# Altium footprint library klp.PcbLib: 436 footprints (part 19 of 28)
Each footprint in its own frame and in the unit in brackets; x right, y up, seen from the top. Pads: shape width x height; smd on the part's side, far side on the other; paste and mask are expansions set on the pad; w line width, h text height; cw(c..) or ccw(c..) is an arc to the next point about the centre after c.
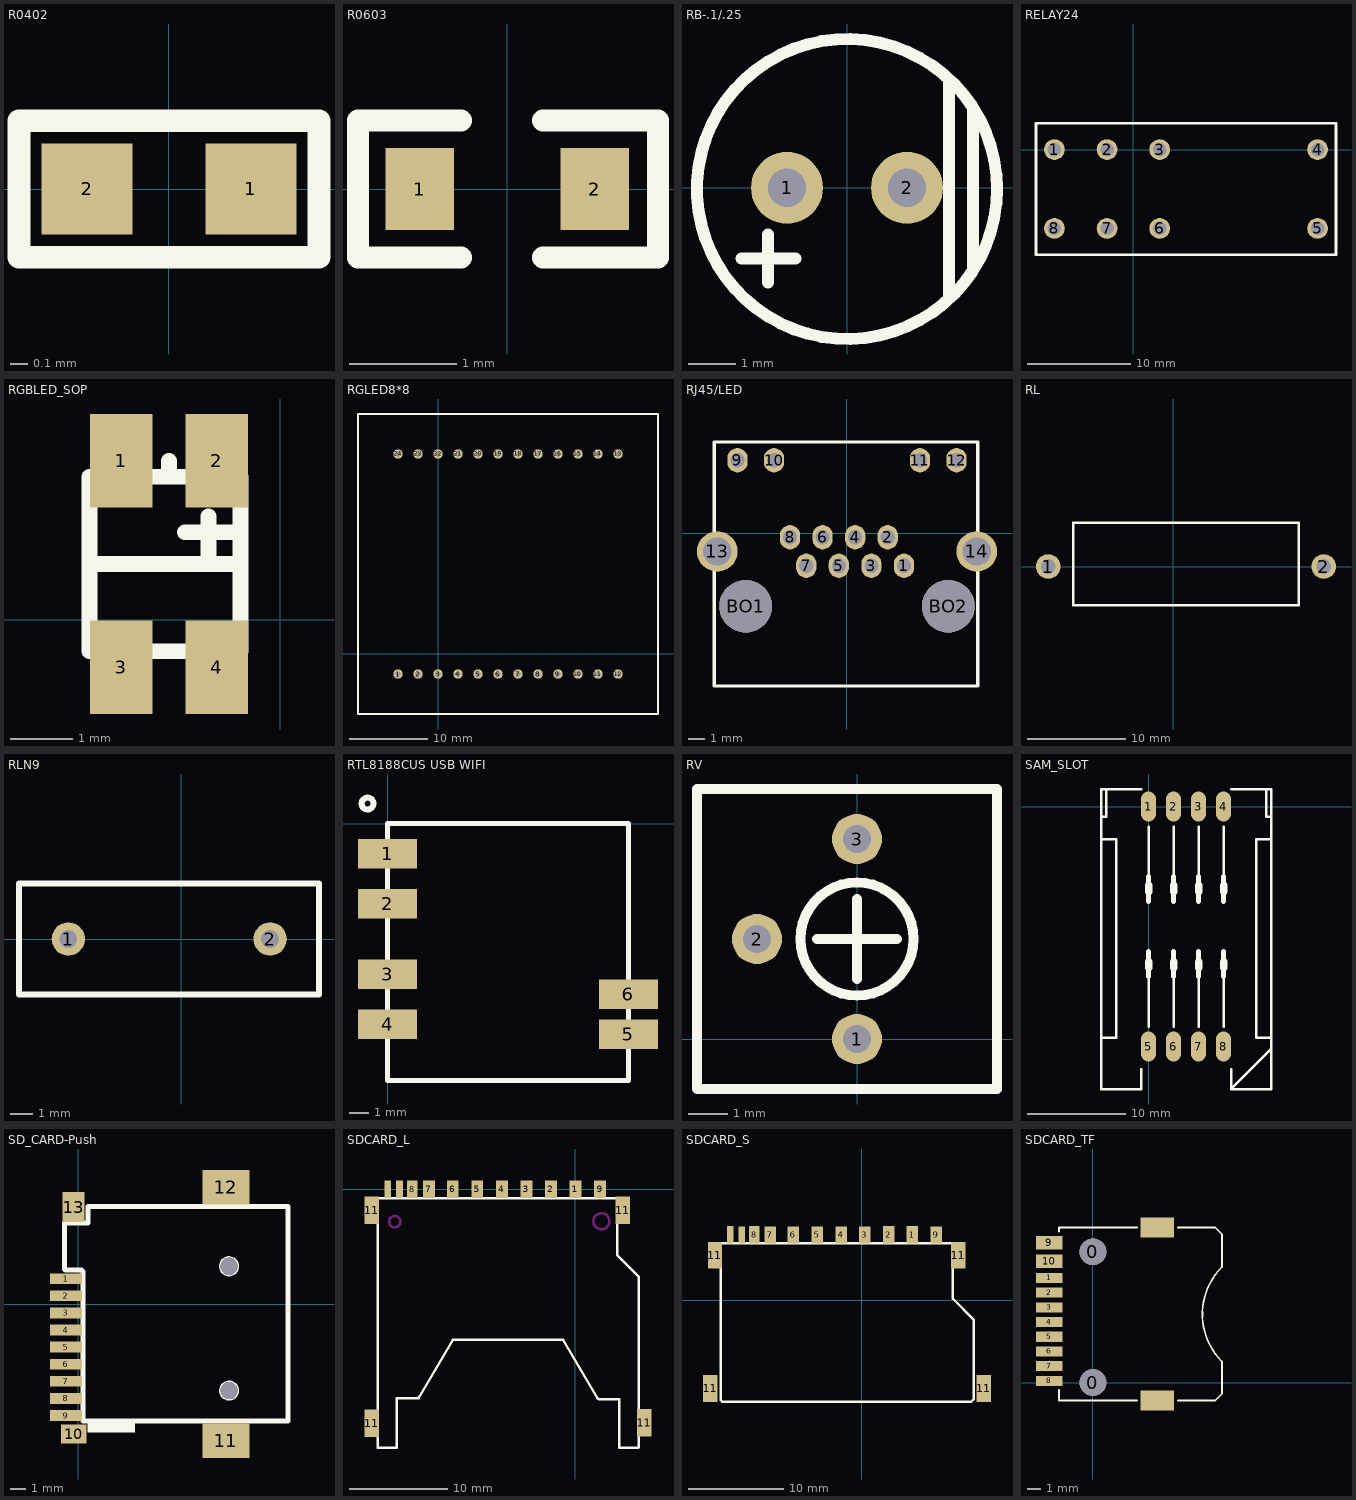
[diagram p18: the footprints below, top view; thin cyan lines are the x and y axes]

## R0402 [mil]
pads (2):
  rect 20x20 smd: 1(18,0) 2(-18,0)
Top Overlay:
  lines w5: -33,-15 33,-15 33,15 -33,15 -33,-15
3D body "R0402.step": height 13.98, standoff 0.2, extent -20.67,-9.83 18.7,9.85

## R0603 [mil]
pads (2):
  rect 25x30 smd: 1(-32,0) 2(32,0)
Top Overlay:
  lines w8: -17,-25.09 -54.63,-25.09 -54.63,25.09 -17,25.09 ; 13,-25.09 55.12,-25.09 55.12,25.09 13,25.09
3D body "R0603.step": height 18.7, standoff 0.98, extent -32.48,-15.75 30.51,15.75

## RB-.1/.25 [mil]
pads (2):
  round 60 hole 32: 1(-50,0) 2(50,0)
Top Overlay:
  circle w10: c0,-1 r125
  lines w10: -88,-59 -43,-59 ; -66,-79 -66,-39 ; 85,-91 85,89 ; 105,-66 105,64
3D body "Radial Capacitor 6.3mm(D) x 11mm(L) 2.5 mm lead spacing.STEP": height 452.76, standoff -728.35, extent -124.02,-124.02 124.02,124.02

## RELAY24 [mm] "HRM1H-S-DC34V-C"
height 20
pads (8):
  round 2 hole 1.3: 1(-7.62,0) 2(-2.54,0) 3(2.54,0) 4(17.78,0) 5(17.78,-7.62) 6(2.54,-7.62) 7(-2.54,-7.62) 8(-7.62,-7.62)
Top Overlay:
  lines w0.254: -9.398,-10.16 -9.398,2.54 19.558,2.54 19.558,-10.16 -9.398,-10.16

## RGBLED_SOP [mm] "SOP_RGB"
height 1
pads (4):
  rect 1x1.5 smd: 1(-2.54,2.54) 2(-1.016,2.54) 3(-2.54,-0.762) 4(-1.016,-0.762)
Top Overlay:
  lines w0.254: -3.048,0.889 -0.635,0.889 ; -1.778,2.286 -1.778,2.54 ; -1.524,1.397 -0.635,1.397 ; -1.143,0.889 -1.143,1.397 -1.143,1.651 ; -3.048,-0.508 -0.635,-0.508 -0.635,2.286 -3.048,2.286 -3.048,1.778 -3.048,0.127 -3.048,-0.508

## RGLED8*8 [mm]
height 8
pads (24):
  round 1.2 hole 0.635: 1(-5.08,-2.54) 2(-2.54,-2.54) 3(0,-2.54) 4(2.54,-2.54) 5(5.08,-2.54) 6(7.62,-2.54) 7(10.16,-2.54) 8(12.7,-2.54) 9(15.24,-2.54) 10(17.78,-2.54) 11(20.32,-2.54) 12(22.86,-2.54) 13(22.86,25.4) 14(20.32,25.4) 15(17.78,25.4) 16(15.24,25.4) 17(12.7,25.4) 18(10.16,25.4) 19(7.62,25.4) 20(5.08,25.4) 21(2.54,25.4) 22(0,25.4) 23(-2.54,25.4) 24(-5.08,25.4)
Top Overlay:
  lines w0.254: -10.16,-7.62 -10.16,30.48 -7.62,30.48 27.94,30.48 27.94,-7.62 -10.16,-7.62

## RJ45/LED [mil]
pads (16):
  oval 50x60 hole 35: 1(140.55,-79.92) 2(100.39,-9.84) 3(60.24,-79.92) 4(20.08,-9.84) 5(-20.08,-79.92) 6(-60.24,-9.84) 7(-100.39,-79.92) 8(-140.55,-9.84) 9(-270.08,179.92) 10(-179.92,179.92) 11(179.92,179.92) 12(270.08,179.92)
  round 100 hole 70: 13(-319.88,-44.88) 14(319.88,-44.88)
  round 130 hole 130: BO1(-250,-179.92) BO2(250,-179.92)
Top Overlay:
  lines w7.99: -327.42,-376.69 -327.42,225.16 ; 322.19,-376.69 322.19,225.08
  lines w8: -327.42,-376.69 322.19,-376.69 ; -327.42,225.16 322,225.16 cw(c322,224.89) 322.19,225.08

## RL [mm] "10o/0.7uH"
height 15
pads (2):
  round 2.5 hole 1.5: 1(-12.7,0) 2(15.24,0)
Top Overlay:
  lines w0.254: -10.16,-3.937 -10.16,4.445 12.7,4.445 12.7,-3.937 7.62,-3.937 -5.08,-3.937 -10.16,-3.937

## RLN9 [mm] "13.5mm*5.1mm"
height 18.2
pads (2):
  round 1.5 hole 0.8: 1(-5.08,0) 2(4,0)
Top Overlay:
  lines w0.254: -7.3,-2.5 6.2,-2.5 6.2,2.5 -7.3,2.5 -7.3,-2.5

## RTL8188CUS USB WIFI [mm]
pads (6):
  rect 3x1.5 smd: 1(0,-1.524) 2(0,-4.064) 3(0,-7.62) 4(0,-10.16) 5(12.192,-10.668) 6(12.192,-8.636)
Top Overlay:
  circle w0.3: c-1.016,1.016 r0.3
  lines w0.254: 0,-13 12.2,-13 12.2,0 0,0 0,-13

## RV [mil]
pads (3):
  round 50 hole 28: 1(0,0) 2(-100,100) 3(0,200)
Top Overlay:
  circle w10: c0,100 r56.57
  lines w10: -40,100 40,100 ; 0,60 0,140 ; -160,-50 140,-50 140,250 -160,250 -160,-50

## SAM_SLOT [mil]
pads (8):
  oval 60x120 smd: 1(0,0) 2(100,0) 3(200,0) 4(300,0) 5(0,-960) 6(100,-960) 7(200,-960) 8(300,-960)
Top Overlay:
  lines w10: -190,-925 -130,-925 -130,-130 -190,-130 ; -190,-40 -170,-40 -170,70 ; -30,-1050 -30,-1130 -190,-1130 -190,70 -30,70 ; 0,-880 0,-580 ; 0,-380 0,-80 ; 100,-880 100,-580 ; 100,-380 100,-80 ; 200,-880 200,-580 ; 200,-380 200,-80 ; 300,-880 300,-580 ; 300,-380 300,-80 ; 330,-1050 330,-1130 ; 330,70 490,70 490,-1130 330,-1130 ; 470,70 470,-40 490,-40 ; 490,-970 330,-1130 ; 490,-925 430,-925 430,-130 490,-130
  lines w20: 0,-680 0,-580 ; 0,-380 0,-280 ; 100,-680 100,-580 ; 100,-380 100,-280 ; 200,-680 200,-580 ; 200,-380 200,-280 ; 300,-680 300,-580 ; 300,-380 300,-280
  lines w30: 0,-645 0,-620 ; 0,-340 0,-315 ; 100,-645 100,-620 ; 100,-340 100,-315 ; 200,-645 200,-620 ; 200,-340 200,-315 ; 300,-645 300,-620 ; 300,-340 300,-315

## SD_CARD-Push [mm] "弹出式TF卡座子"
pads (15):
  rect 2.057x0.7 smd: 1(-0.801,1.642) 2(-0.801,0.542) 3(-0.801,-0.558) 4(-0.801,-1.658) 5(-0.801,-2.758) 6(-0.801,-3.858) 7(-0.801,-4.958) 8(-0.801,-6.058) 9(-0.801,-7.158)
  rect 1.629x1.225 smd: 10(-0.301,-8.358)
  rect 3x2.2 smd: 11(9.5,-8.778) 12(9.5,7.52)
  rect 1.4x1.93 smd: 13(-0.301,6.242)
  round 1.1 hole 1.1: ""(9.699,-5.558) ""(9.699,2.442)
Top Overlay:
  circle w0.1: c9.699,-5.558 r0.6
  circle w0.1: c9.699,2.442 r0.6
  region: 3.648,-8.258 3.648,-7.558 0.598,-7.558 0.598,-8.258
  lines w0.33: 0.624,6.217 0.624,5.217 -0.876,5.217 -0.876,2.242 -0.826,2.192 0.199,2.192 0.299,2.092 0.299,-7.508 13.499,-7.508 13.499,6.292 0.624,6.292

## SDCARD_L [mm] "SDCARD_LARGE"
height 1
pads (15):
  rect 1.2x1.8 smd: 1(0,0) 2(-2.489,0) 3(-4.983,-0.009) 4(-7.483,-0.009) 5(-9.983,-0.009) 6(-12.483,-0.009) 7(-14.908,-0.009) 9(2.517,-0.009)
  rect 1.1x1.8 smd: 8(-16.612,0)
  rect 0.7x1.8 smd: 10(-17.908,-0.009) 12(-19.101,0)
  rect 1.5x2.8 smd: 11(-20.726,-23.834) 11(-20.726,-2.143) 11(4.826,-2.143) 11(7.01,-23.784)
Top Overlay:
  lines w0.254: -18.158,-21.3 -18.158,-26.3 -20.131,-26.3 -20.131,-0.914 -20.117,-0.9 4.242,-0.9 4.242,-6.71 6.431,-8.899 6.442,-8.899 6.442,-26.273 6.415,-26.3 4.442,-26.3 4.442,-21.402 2.4,-21.402 2.242,-21.244 ; -18.107,-21.294 -16.065,-21.294 -15.907,-21.136 ; -15.958,-21.294 -12.446,-15.3 ; -12.458,-15.3 -1.258,-15.3 2.242,-21.294
Keep-Out Layer:
  circle w0.254: c-18.39,-3.3 r0.58
  circle w0.254: c2.642,-3.26 r0.82

## SDCARD_S [mm] "SDCARD_SMALL"
height 1.524
pads (15):
  rect 1.2x1.8 smd: 1(5.334,6.867) 2(2.845,6.867) 3(0.351,6.858) 4(-2.149,6.858) 5(-4.649,6.858) 6(-7.149,6.858) 7(-9.574,6.858) 9(7.851,6.858)
  rect 1.1x1.8 smd: 8(-11.278,6.867)
  rect 0.7x1.8 smd: 10(-12.574,6.858) 12(-13.767,6.867)
  rect 1.5x2.8 smd: 11(-15.875,-9.271) 11(-15.392,4.724) 11(10.16,4.724) 11(12.827,-9.271)
Top Overlay:
  lines w0.254: -14.797,5.953 -14.783,5.967 ; -14.783,5.967 9.576,5.967 9.576,0.157 11.765,-2.032 11.776,-2.032 11.776,-10.414 11.522,-10.668 -14.605,-10.668 -14.783,-10.49 -14.783,5.967
Multi-Layer:
  circle w0.254: c-13.056,3.567 r0.58
  circle w0.254: c7.976,3.607 r0.82

## SDCARD_TF [mm] "TFCARD"
height 1
pads (14):
  round 2 hole 2: 0(0,-0.002) 0(0,9.777)
  rect 2x0.75 smd: 1(-3.26,7.827) 2(-3.26,6.727) 3(-3.26,5.627) 4(-3.26,4.527) 5(-3.26,3.427) 6(-3.26,2.327) 7(-3.26,1.227) 8(-3.26,0.127)
  rect 2x1 smd: 9(-3.26,10.463) 10(-3.26,9.079)
  rect 2.5x1.5 smd: ""(4.826,-1.348) ""(4.826,11.606)
Top Overlay:
  lines w0.127: -2.54,-1.348 3.302,-1.348 ; -2.54,11.301 -2.54,11.606 3.302,11.606 ; -2.535,-1.348 -2.535,-0.548 ; 6.35,-1.348 9.144,-1.348 9.652,-0.84 9.652,1.319 9.652,1.573 cw(c13.188,5.109) 9.652,8.644 9.652,11.098 9.144,11.606 6.35,11.606